# Altium footprint library Misc.PCBLIB: 128 footprints (part 7 of 8)
Each footprint in its own frame and in the unit in brackets; x right, y up, seen from the top. Pads: shape width x height; smd on the part's side, far side on the other; paste and mask are expansions set on the pad; w line width, h text height; cw(c..) or ccw(c..) is an arc to the next point about the centre after c.
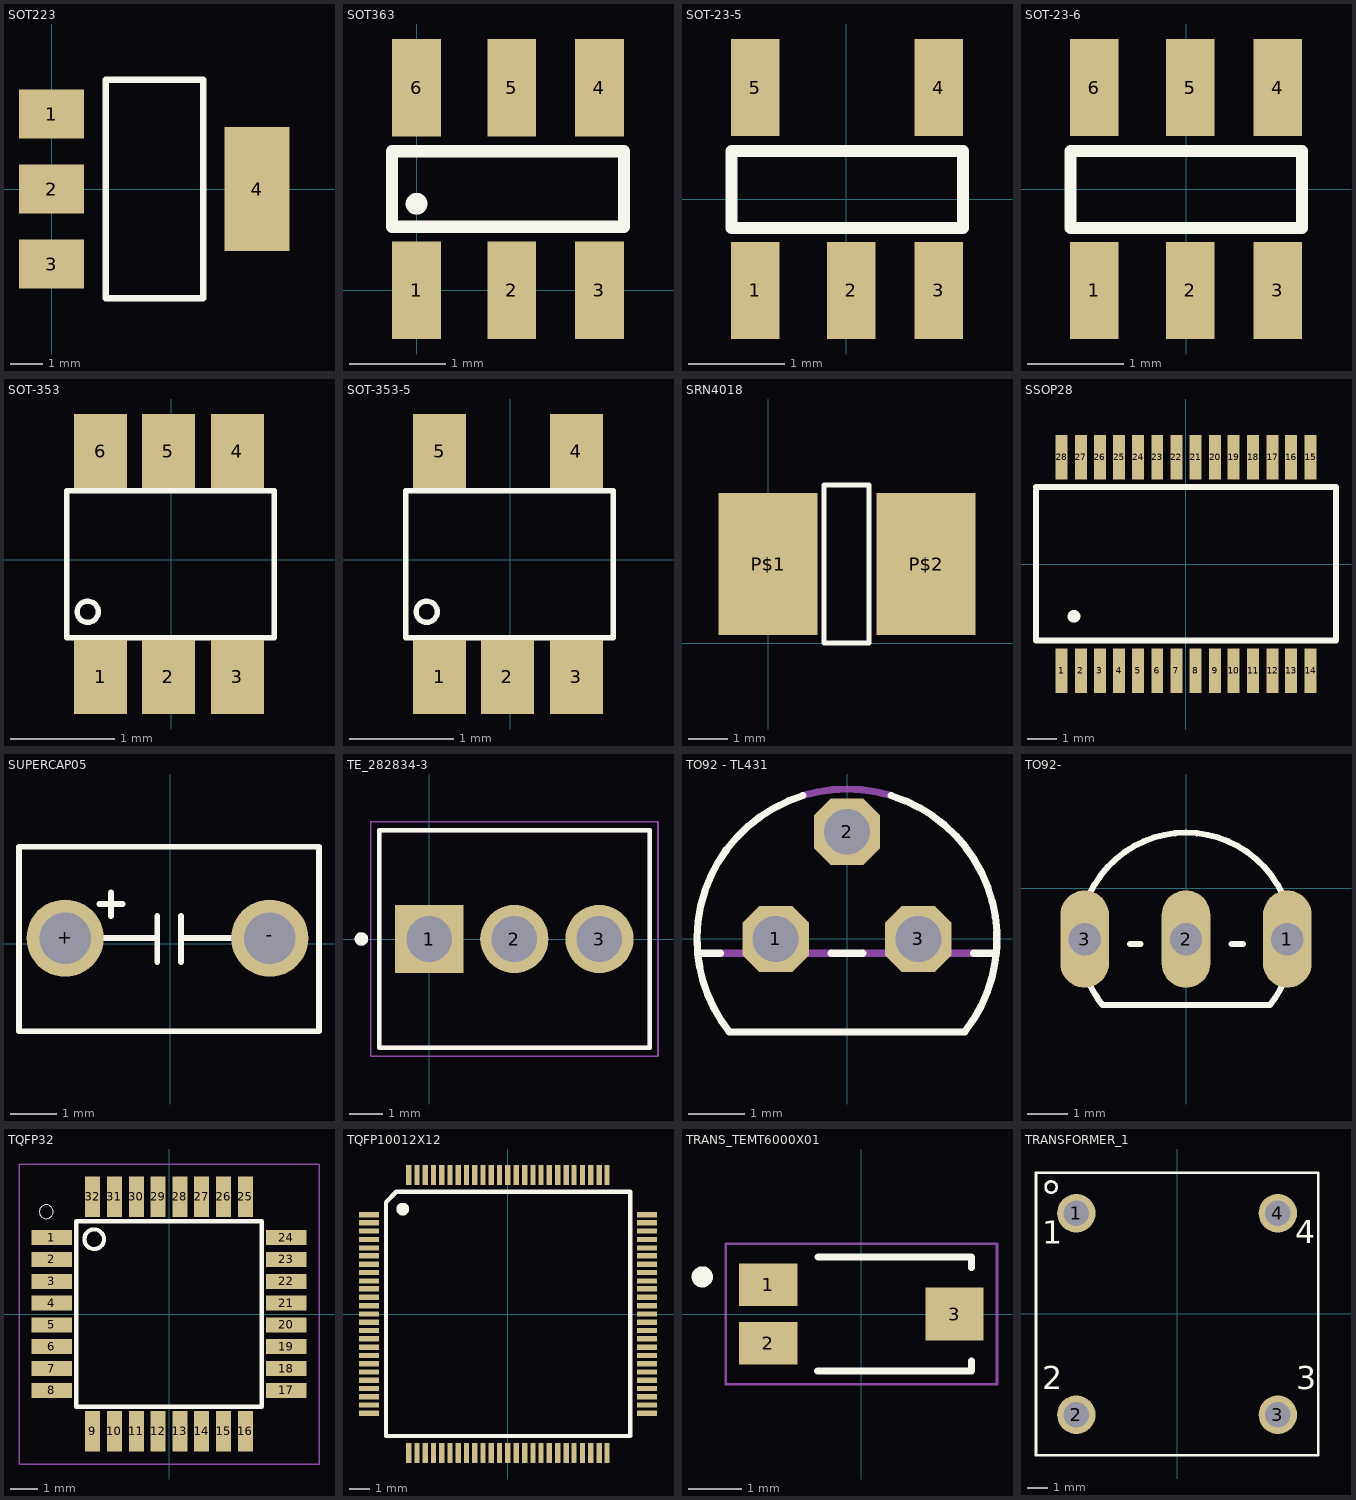
[diagram p6: the footprints below, top view; thin cyan lines are the x and y axes]

## SOT223 [mm] "SOT223, 4-Leads"
height 1.7
pads (4):
  rect 2x1.5 smd: 1(0,2.3) 2(0,0) 3(0,-2.3)
  rect 2x3.8 smd: 4(6.3,0)
Top Overlay:
  lines w0.2: 1.655,-3.35 4.655,-3.35 4.655,3.35 1.655,3.35 1.655,-3.35
3D body "User Library-SOT233.step": height 1.7, standoff 0, extent -0.322,-3.35 6.978,3.35

## SOT363 [mil]
pads (6):
  rect 20x40 smd: 1(0,0) 2(39,0) 3(75,0) 4(75,83) 5(39,83) 6(0,83)
Top Overlay:
  circle w5: c0,35.43 r1.97
  lines w5: -10,26 -10,57 85,57 85,26 -10,26

## SOT-23-5 [mil]
pads (5):
  rect 20x40 smd: 1(-37.4,-37.4) 2(2,-37.4) 3(38,-37.4) 4(38,46) 5(-37.4,46)
Top Overlay:
  lines w5: -47.24,-11.81 -47.24,20 48,20 48,-11.81 -47.24,-11.81
3D body "CircuitWorks-SOT-23-5.step": height 42.13, standoff -1.18, extent -57.87,-43.3 60.24,55.12

## SOT-23-6 [mil]
pads (6):
  rect 20x40 smd: 1(-37.7,-41.7) 2(1.7,-41.7) 3(37.7,-41.7) 4(37.7,41.7) 5(1.7,41.7) 6(-37.7,41.7)
Top Overlay:
  lines w5: -47.54,-16.11 -47.54,15.7 47.7,15.7 47.7,-16.11 -47.54,-16.11
3D body "User Library-sot236.step": height 39.37, standoff 0, extent -56.29,-44.48 58.67,47.64

## SOT-353 [mil]
pads (6):
  rect 20x28 smd: 1(-26.57,-44.29) 2(-0.98,-44.29) 3(25,-44.29) 4(25,41) 5(-0.98,41) 6(-26.57,41)
Top Overlay:
  circle w2: c-31.5,-19.68 r4
  lines w2: -39.37,-29.53 39,-29.53 39,26 -39.37,26 -39.37,-29.53

## SOT-353-5 [mil]
pads (5):
  rect 20x28 smd: 1(-26.57,-44.29) 2(-0.98,-44.29) 3(25,-44.29) 4(25,41) 5(-26.57,41)
Top Overlay:
  circle w2: c-31.5,-19.68 r4
  lines w2: -39.37,-29.53 39,-29.53 39,26 -39.37,26 -39.37,-29.53
3D body "28013.stp": height 36.61, standoff -0.79, extent -40.17,-43.71 38.57,38.97

## SRN4018 [mil]
pads (2):
  rect 99x142 smd: P$1(0,79) P$2(158,79)
Top Overlay:
  lines w5: 56,0 101,0 101,158 56,158 56,0
3D body: height 70.87, standoff 0, extent -43.31,7.87 205.12,150

## SSOP28 [mil]
pads (28):
  rect 16x60 smd: 1(-166.34,-142.72) 2(-140.75,-142.72) 3(-115.16,-142.72) 4(-89.57,-142.72) 5(-63.98,-142.72) 6(-38.39,-142.72) 7(-12.8,-142.72) 8(13,-142.72) 9(39,-142.72) 10(64,-142.72) 11(90,-142.72) 12(116,-142.72) 13(141,-142.72) 14(167,-142.72) 15(167,143) 16(141,143) 17(116,143) 18(90,143) 19(64,143) 20(39,143) 21(13,143) 22(-12.8,143) 23(-38.39,143) 24(-63.98,143) 25(-89.57,143) 26(-115.16,143) 27(-140.75,143) 28(-166.34,143)
Top Overlay:
  circle w15: c-150,-70 r1
  lines w8: -200.79,-102.36 201,-102.36 201,103 -200.79,103 ; -200.79,-100 -200.79,100

## SUPERCAP05 [mil]
pads (2):
  round 66 hole 44: +(-90,5) -(85,5)
Top Overlay:
  lines w5: -60.47,5 -11.26,5 ; -60.47,34 -40.79,34 ; -50.63,24 -50.63,44 ; -11.26,-15.51 -11.26,5 ; -11.26,24 -11.26,5 ; 9,-15.51 9,5 ; 9,24 9,5 ; 58,5 9,5 ; -129.37,-74.57 127,-74.57 127,83 -129.37,83 -129.37,-74.57

## TE_282834-3 [mm]
pads (3):
  rect 2.04x2.04 hole 1.36: 1(0,0)
  round 2.04 hole 1.36: 2(2.54,0) 3(5.08,0)
Top Overlay:
  circle w0.2: c-2.032,0 r0.1
  lines w0.127: -1.5,-3.25 6.58,-3.25 6.58,3.25 -1.5,3.25 -1.5,-3.25
Mechanical 4:
  circle w0.2: c-2.032,0 r0.1
  circle w0.2: c-2.032,0 r0.1
  lines w0.127: -1.5,-3.25 6.58,-3.25 ; -1.5,-3.25 -1.5,3.25 ; -1.5,-3.25 6.58,-3.25 ; -1.5,-3.25 -1.5,3.25 ; -1.5,3.25 6.58,3.25 ; -1.5,3.25 6.58,3.25 ; 6.58,-3.25 6.58,3.25 ; 6.58,-3.25 6.58,3.25
Mechanical 16:
  lines w0.05: -1.75,-3.5 6.83,-3.5 6.83,3.5 -1.75,3.5 -1.75,-3.5

## TO92 - TL431 [mil]
pads (3):
  oct 46.48x46.48 hole 32: 1(-50,0) 2(0,75) 3(50,0)
Top Overlay:
  lines w5: -88.73,-10 -104.52,-10 ; -30.96,100.33 ccw(c0,0) -104.52,-10 ; -11.27,-10 11.27,-10 ; 30.96,100.33 cw(c0,0) 82.46,-65 -82.46,-65 cw(c0,0) -104.52,-10 ; 88.73,-10 104.52,-10
Mechanical 4:
  lines w5: -88.73,-10 -11.27,-10 ; -30.96,100.33 cw(c0,-0.02) 30.96,100.33 ; 11.27,-10 88.73,-10

## TO92- [mil]
pads (3):
  oval 48x96 hole 32: 1(100,-50) 2(0,-50) 3(-100,-50)
Top Overlay:
  lines w6: -95.02,-94.72 ccw(c-0.02,-50) -82.48,-115 83,-115 ccw(c0.55,-49.91) 96,-93.77 ; -95,-5.28 cw(c0,-50) 95,-5.28 ; -55.28,-55 -44.72,-55 ; 45,-55 56,-55

## TQFP32 [mm]
pads (32):
  rect 1.5x0.55 smd: 1(-4.3,2.8) 2(-4.3,2) 3(-4.3,1.2) 4(-4.3,0.4) 5(-4.3,-0.4) 6(-4.3,-1.2) 7(-4.3,-2) 8(-4.3,-2.8) 17(4.3,-2.8) 18(4.3,-2) 19(4.3,-1.2) 20(4.3,-0.4) 21(4.3,0.4) 22(4.3,1.2) 23(4.3,2) 24(4.3,2.8)
  rect 0.55x1.5 smd: 9(-2.8,-4.3) 10(-2,-4.3) 11(-1.2,-4.3) 12(-0.4,-4.3) 13(0.4,-4.3) 14(1.2,-4.3) 15(2,-4.3) 16(2.8,-4.3) 25(2.8,4.3) 26(2,4.3) 27(1.2,4.3) 28(0.4,4.3) 29(-0.4,4.3) 30(-1.2,4.3) 31(-2,4.3) 32(-2.8,4.3)
Top Overlay:
  circle w0: c-4.5,3.75 r0.254
  circle w0.152: c-2.743,2.743 r0.359
  lines w0.152: -3.4,-3.4 -3.4,3.4 3.4,3.4 3.4,-3.4 -3.4,-3.4
Mechanical 4:
  lines w0.05: -5.5,-5.5 -5.5,5.5 5.5,5.5 5.5,-5.5 -5.5,-5.5
3D body "User Library-tqfp32.step": height 1.2, standoff 0, extent -4.6,-4.599 4.599,4.599

## TQFP10012X12 [mil]
pads (100):
  rect 38x10 smd: 1(-264.76,189) 2(-264.76,174) 3(-264.76,158) 4(-264.76,142) 5(-264.76,126) 6(-264.76,111) 7(-264.76,95) 8(-264.76,79) 9(-264.76,63) 10(-264.76,48) 11(-264.76,32) 12(-264.76,16) 13(-264.76,0) 14(-264.76,-15.75) 15(-264.76,-31.5) 16(-264.76,-47.24) 17(-264.76,-62.99) 18(-264.76,-78.74) 19(-264.76,-94.49) 20(-264.76,-110.24) 21(-264.76,-125.98) 22(-264.76,-141.73) 23(-264.76,-157.48) 24(-264.76,-173.23) 25(-264.76,-188.98) 51(265,-188.98) 52(265,-173.23) 53(265,-157.48) 54(265,-141.73) 55(265,-125.98) 56(265,-110.24) 57(265,-94.49) 58(265,-78.74) 59(265,-62.99) 60(265,-47.24) 61(265,-31.5) 62(265,-15.75) 63(265,0) 64(265,16) 65(265,32) 66(265,48) 67(265,63) 68(265,79) 69(265,95) 70(265,111) 71(265,126) 72(265,142) 73(265,158) 74(265,174) 75(265,189)
  rect 10x38 smd: 26(-188.98,-264.76) 27(-173.23,-264.76) 28(-157.48,-264.76) 29(-141.73,-264.76) 30(-125.98,-264.76) 31(-110.24,-264.76) 32(-94.49,-264.76) 33(-78.74,-264.76) 34(-62.99,-264.76) 35(-47.24,-264.76) 36(-31.5,-264.76) 37(-15.75,-264.76) 38(0,-264.76) 39(16,-264.76) 40(32,-264.76) 41(48,-264.76) 42(63,-264.76) 43(79,-264.76) 44(95,-264.76) 45(111,-264.76) 46(126,-264.76) 47(142,-264.76) 48(158,-264.76) 49(174,-264.76) 50(189,-264.76) 76(189,265) 77(174,265) 78(158,265) 79(142,265) 80(126,265) 81(111,265) 82(95,265) 83(79,265) 84(63,265) 85(48,265) 86(32,265) 87(16,265) 88(0,265) 89(-15.75,265) 90(-31.5,265) 91(-47.24,265) 92(-62.99,265) 93(-78.74,265) 94(-94.49,265) 95(-110.24,265) 96(-125.98,265) 97(-141.73,265) 98(-157.48,265) 99(-173.23,265) 100(-188.98,265)
Top Overlay:
  circle w20: c-200,200 r2
  lines w8: -232.22,-232.22 233,-232.22 233,233 -212.6,233 -232.22,213 -232.22,-232.22
Top Solder:
  rectangle: -285.43,184 -244.09,195
  rectangle: -285.43,168 -244.09,180
  rectangle: -285.43,152 -244.09,164
  rectangle: -285.43,136 -244.09,148
  rectangle: -285.43,121 -244.09,132
  rectangle: -285.43,105 -244.09,117
  rectangle: -285.43,89 -244.09,101
  rectangle: -285.43,73 -244.09,85
  rectangle: -285.43,58 -244.09,69
  rectangle: -285.43,42 -244.09,54
  rectangle: -285.43,26 -244.09,38
  rectangle: -285.43,10 -244.09,22
  rectangle: -285.43,-5.91 -244.09,6
  rectangle: -285.43,-21.65 -244.09,-9.84
  rectangle: -285.43,-37.4 -244.09,-25.59
  rectangle: -285.43,-53.15 -244.09,-41.34
  rectangle: -285.43,-68.9 -244.09,-57.09
  rectangle: -285.43,-84.65 -244.09,-72.83
  rectangle: -285.43,-100.39 -244.09,-88.58
  rectangle: -285.43,-116.14 -244.09,-104.33
  rectangle: -285.43,-131.89 -244.09,-120.08
  rectangle: -285.43,-147.64 -244.09,-135.83
  rectangle: -285.43,-163.39 -244.09,-151.57
  rectangle: -285.43,-179.13 -244.09,-167.32
  rectangle: -285.43,-194.88 -244.09,-183.07
  region: -183.07,-285.43 -183.07,-244.09 -194.88,-244.09 -194.88,-285.43
  region: -167.32,-285.43 -167.32,-244.09 -179.13,-244.09 -179.13,-285.43
  region: -151.57,-285.43 -151.57,-244.09 -163.39,-244.09 -163.39,-285.43
  region: -135.83,-285.43 -135.83,-244.09 -147.64,-244.09 -147.64,-285.43
  region: -120.08,-285.43 -120.08,-244.09 -131.89,-244.09 -131.89,-285.43
  region: -104.33,-285.43 -104.33,-244.09 -116.14,-244.09 -116.14,-285.43
  region: -88.58,-285.43 -88.58,-244.09 -100.39,-244.09 -100.39,-285.43
  region: -72.83,-285.43 -72.83,-244.09 -84.65,-244.09 -84.65,-285.43
  region: -57.09,-285.43 -57.09,-244.09 -68.9,-244.09 -68.9,-285.43
  region: -41.34,-285.43 -41.34,-244.09 -53.15,-244.09 -53.15,-285.43
  region: -25.59,-285.43 -25.59,-244.09 -37.4,-244.09 -37.4,-285.43
  region: -9.8,-285.47 -9.8,-244.06 -21.61,-244.06 -21.61,-285.47
  region: 6.07,-285.6 6.07,-243.93 -5.74,-243.93 -5.74,-285.6
  region: 21.94,-285.72 21.94,-243.8 10.13,-243.8 10.13,-285.72
  region: 37.91,-285.76 37.91,-243.76 26.09,-243.76 26.09,-285.76
  region: 53.41,-285.26 53.41,-244.26 41.59,-244.26 41.59,-285.26
  region: 69.41,-285.26 69.41,-244.26 57.59,-244.26 57.59,-285.26
  region: 85.41,-285.26 85.41,-244.26 73.59,-244.26 73.59,-285.26
  region: 100.91,-285.76 100.91,-243.76 89.09,-243.76 89.09,-285.76
  region: 116.41,-285.26 116.41,-244.26 104.59,-244.26 104.59,-285.26
  region: 132.41,-285.26 132.41,-244.26 120.59,-244.26 120.59,-285.26
  region: 148.41,-285.26 148.41,-244.26 136.59,-244.26 136.59,-285.26
  region: 163.91,-285.76 163.91,-243.76 152.09,-243.76 152.09,-285.76
  region: 179.41,-285.26 179.41,-244.26 167.59,-244.26 167.59,-285.26
  region: 195.41,-285.26 195.41,-244.26 183.59,-244.26 183.59,-285.26
  region: 286,-183.07 245,-183.07 245,-194.88 286,-194.88
  region: 286,-167.32 245,-167.32 245,-179.13 286,-179.13
  region: 286,-151.57 245,-151.57 245,-163.39 286,-163.39
  region: 286,-135.83 245,-135.83 245,-147.64 286,-147.64
  region: 286,-120.08 245,-120.08 245,-131.89 286,-131.89
  region: 286,-104.33 245,-104.33 245,-116.14 286,-116.14
  region: 286,-88.58 245,-88.58 245,-100.39 286,-100.39
  region: 286,-72.83 245,-72.83 245,-84.65 286,-84.65
  region: 286,-57.09 245,-57.09 245,-68.9 286,-68.9
  region: 286,-41.34 245,-41.34 245,-53.15 286,-53.15
  region: 286,-25.59 245,-25.59 245,-37.4 286,-37.4
  region: 286,-9.84 245,-9.84 245,-21.65 286,-21.65
  region: 286,6 245,6 245,-5.91 286,-5.91
  region: 286,22 245,22 245,10 286,10
  region: 286,38 245,38 245,26 286,26
  region: 286,54 245,54 245,42 286,42
  region: 286,69 245,69 245,58 286,58
  region: 286,85 245,85 245,73 286,73
  region: 286,101 245,101 245,89 286,89
  region: 286,117 245,117 245,105 286,105
  region: 286,132 245,132 245,121 286,121
  region: 286,148 245,148 245,136 286,136
  region: 286,164 245,164 245,152 286,152
  region: 286,180 245,180 245,168 286,168
  region: 286,195 245,195 245,184 286,184
  region: 183.5,285.5 183.5,244.5 195.5,244.5 195.5,285.5
  region: 167.5,285.5 167.5,244.5 179.5,244.5 179.5,285.5
  region: 152,286 152,244 164,244 164,286
  region: 136.5,285.5 136.5,244.5 148.5,244.5 148.5,285.5
  region: 120.5,285.5 120.5,244.5 132.5,244.5 132.5,285.5
  region: 104.5,285.5 104.5,244.5 116.5,244.5 116.5,285.5
  region: 89,286 89,244 101,244 101,286
  region: 73.5,285.5 73.5,244.5 85.5,244.5 85.5,285.5
  region: 57.5,285.5 57.5,244.5 69.5,244.5 69.5,285.5
  region: 41.5,285.5 41.5,244.5 53.5,244.5 53.5,285.5
  region: 26,286 26,244 38,244 38,286
  region: 10.04,285.96 10.04,244.04 22.04,244.04 22.04,285.96
  region: -5.83,285.83 -5.83,244.17 6.17,244.17 6.17,285.83
  region: -21.71,285.71 -21.71,244.29 -9.71,244.29 -9.71,285.71
  region: -37.5,285.67 -37.5,244.33 -25.5,244.33 -25.5,285.67
  region: -53.24,285.67 -53.24,244.33 -41.24,244.33 -41.24,285.67
  region: -68.99,285.67 -68.99,244.33 -56.99,244.33 -56.99,285.67
  region: -84.74,285.67 -84.74,244.33 -72.74,244.33 -72.74,285.67
  region: -100.49,285.67 -100.49,244.33 -88.49,244.33 -88.49,285.67
  region: -116.24,285.67 -116.24,244.33 -104.24,244.33 -104.24,285.67
  region: -131.98,285.67 -131.98,244.33 -119.98,244.33 -119.98,285.67
  region: -147.73,285.67 -147.73,244.33 -135.73,244.33 -135.73,285.67
  region: -163.48,285.67 -163.48,244.33 -151.48,244.33 -151.48,285.67
  region: -179.23,285.67 -179.23,244.33 -167.23,244.33 -167.23,285.67
  region: -194.98,285.67 -194.98,244.33 -182.98,244.33 -182.98,285.67

## TRANS_TEMT6000X01 [mm]
pads (3):
  rect 1.1x0.8 smd: 1(-1.755,0.55) 2(-1.755,-0.55)
  rect 1.1x1 smd: 3(1.755,0)
Top Overlay:
  circle w0.2: c-3,0.7 r0.1
  lines w0.127: -0.83,-1.075 2.075,-1.075 2.075,-0.88 ; -0.82,1.075 2.075,1.075 2.075,0.87
Mechanical 4:
  lines w0.05: -2.555,-1.325 -2.555,1.325 2.555,1.325 2.555,-1.325 -2.555,-1.325
3D body: height 1.05, standoff 0, extent -2,-1 2,1

## TRANSFORMER_1 [mm]
pads (4):
  round 1.905 hole 1.27: 1(-5,5) 2(-5,-5) 3(5,-5) 4(5,5)
Top Overlay:
  circle w0.127: c-6.248,6.299 r0.279
  lines w0.127: -7,-7 -7,7 7,7 7,-7 -7,-7
  text "1" at -6.678,3.099 h1.97
  text "2" at -6.68,-4.14 h1.97
  text "3" at 5.917,-4.14 h1.97
  text "4" at 5.867,3.106 h1.97
3D body: height 15, standoff 0.8, extent -6.833,-6.833 6.833,6.833